# Altium footprint library UWRT_Footprint_Library_2020.PcbLib: 376 footprints (part 19 of 24)
Each footprint in its own frame and in the unit in brackets; x right, y up, seen from the top. Pads: shape width x height; smd on the part's side, far side on the other; paste and mask are expansions set on the pad; w line width, h text height; cw(c..) or ccw(c..) is an arc to the next point about the centre after c.
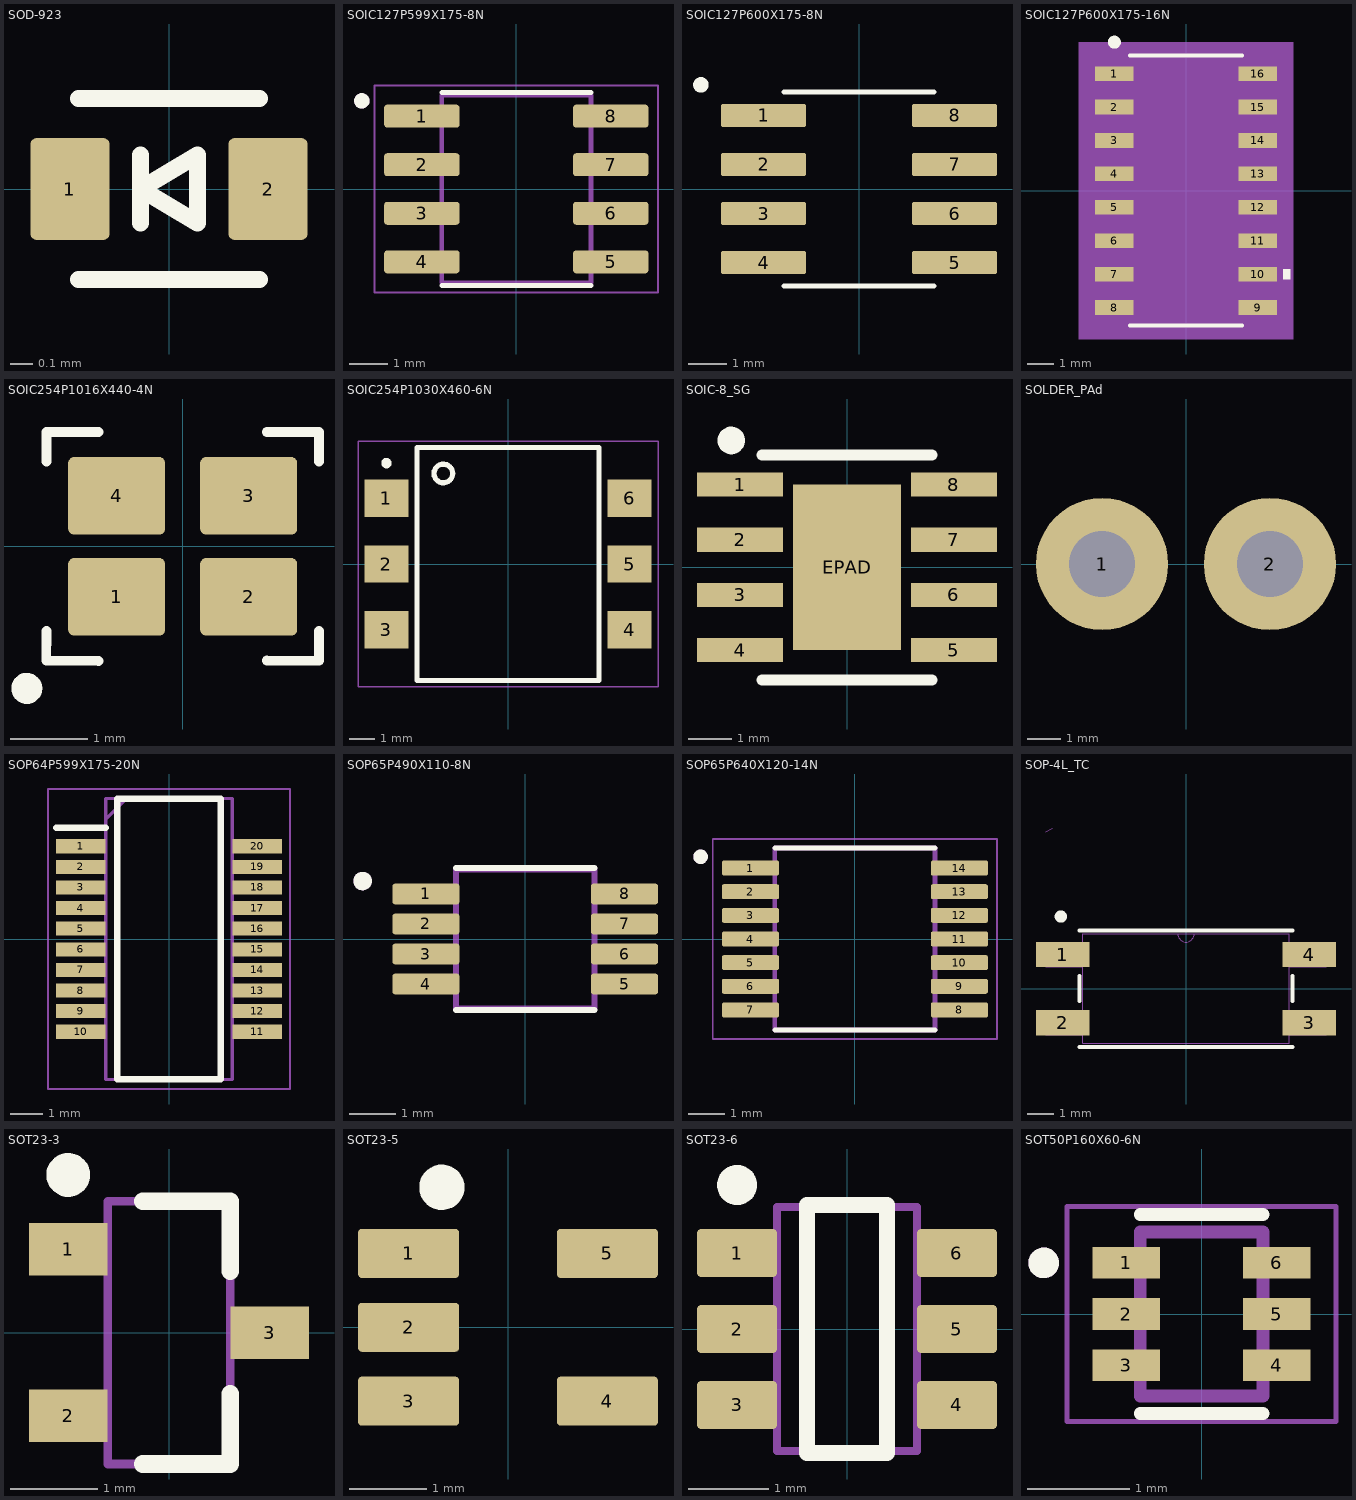
[diagram p18: the footprints below, top view; thin cyan lines are the x and y axes]

## SOD-923 [mm]
pads (2):
  rrect15% 0.35x0.45 smd mask+0.05: 1(-0.437,0) 2(0.437,0)
Top Overlay:
  lines w0.075: -0.4,-0.4 0.4,-0.4 ; -0.4,0.4 0.4,0.4 ; -0.125,-0.15 -0.125,0.15 ; -0.125,0 0.125,0.15 0.125,-0.15 -0.125,0
3D body "SOD-923.step": height 0.43, standoff 0, extent -0.525,-0.325 0.525,0.325

## SOIC127P599X175-8N [mm]
pads (8):
  rrect25% 1.97x0.6 smd: 1(-2.47,1.905) 2(-2.47,0.635) 3(-2.47,-0.635) 4(-2.47,-1.905) 5(2.47,-1.905) 6(2.47,-0.635) 7(2.47,0.635) 8(2.47,1.905)
Top Overlay:
  circle w0.2: c-4.04,2.305 r0.1
  lines w0.127: -1.95,-2.525 1.95,-2.525 ; -1.95,2.525 1.95,2.525
Mechanical 13:
  circle w0.2: c-4.04,2.305 r0.1
  lines w0.127: -1.95,-2.452 1.95,-2.452 1.95,2.452 -1.95,2.452 -1.95,-2.452
Mechanical 15:
  lines w0.05: -3.705,-2.702 3.705,-2.702 3.705,2.702 -3.705,2.702 -3.705,-2.702
3D body "step_temp.STEP": height 1.75, standoff 0, extent -2.997,-2.451 2.997,2.451

## SOIC127P600X175-8N [mm]
pads (8):
  rrect15% 2.2x0.6 smd: 1(-2.475,1.905) 2(-2.475,0.635) 3(-2.475,-0.635) 4(-2.475,-1.905) 5(2.475,-1.905) 6(2.475,-0.635) 7(2.475,0.635) 8(2.475,1.905)
Top Overlay:
  circle w0.2: c-4.1,2.7 r0.1
  lines w0.127: -1.95,-2.51 1.95,-2.51 ; -1.95,2.51 1.95,2.51
3D body "MAX485CSA+T.STEP": height 1.75, standoff 0, extent -3,-2.45 3,2.45

## SOIC127P600X175-16N [mm]
pads (16):
  rect 1.455x0.558 smd paste+0 mask+0: 1(-2.721,4.445) 2(-2.721,3.175) 3(-2.721,1.905) 4(-2.721,0.635) 5(-2.721,-0.635) 6(-2.721,-1.905) 7(-2.721,-3.175) 8(-2.721,-4.445) 9(2.721,-4.445) 10(2.721,-3.175) 11(2.721,-1.905) 12(2.721,-0.635) 13(2.721,0.635) 14(2.721,1.905) 15(2.721,3.175) 16(2.721,4.445)
Top Overlay:
  circle w0.254: c-2.721,5.639 r0.121
  region: 3.703,-2.984 3.957,-2.984 3.957,-3.365 3.703,-3.365
  lines w0.152: -2.121,-5.131 2.121,-5.131 ; -2.121,5.131 2.121,5.131
Mechanical 5:
  region: 4.084,-5.639 -4.084,-5.639 -4.084,5.639 4.084,5.639
Mechanical 13:
  lines w0: -0.305,5.004 ccw(c0,5.004) 0.305,5.004
  lines w0.025: -3.099,-4.699 -1.994,-4.699 -1.994,-4.191 -3.099,-4.191 -3.099,-4.699 ; -3.099,-3.429 -1.994,-3.429 -1.994,-2.921 -3.099,-2.921 -3.099,-3.429 ; -3.099,-2.159 -1.994,-2.159 -1.994,-1.651 -3.099,-1.651 -3.099,-2.159 ; -3.099,-0.889 -1.994,-0.889 -1.994,-0.381 -3.099,-0.381 -3.099,-0.889 ; -3.099,0.381 -1.994,0.381 -1.994,0.889 -3.099,0.889 -3.099,0.381 ; -3.099,1.651 -1.994,1.651 -1.994,2.159 -3.099,2.159 -3.099,1.651 ; -3.099,2.921 -1.994,2.921 -1.994,3.429 -3.099,3.429 -3.099,2.921 ; -3.099,4.191 -1.994,4.191 -1.994,4.699 -3.099,4.699 -3.099,4.191 ; -1.994,-5.004 -1.994,5.004 1.994,5.004 1.994,-5.004 -1.994,-5.004 ; 1.994,-4.699 3.099,-4.699 3.099,-4.191 1.994,-4.191 1.994,-4.699 ; 1.994,-3.429 3.099,-3.429 3.099,-2.921 1.994,-2.921 1.994,-3.429 ; 1.994,-2.159 3.099,-2.159 3.099,-1.651 1.994,-1.651 1.994,-2.159 ; 1.994,-0.889 3.099,-0.889 3.099,-0.381 1.994,-0.381 1.994,-0.889 ; 1.994,0.381 3.099,0.381 3.099,0.889 1.994,0.889 1.994,0.381 ; 1.994,1.651 3.099,1.651 3.099,2.159 1.994,2.159 1.994,1.651 ; 1.994,2.921 3.099,2.921 3.099,3.429 1.994,3.429 1.994,2.921 ; 1.994,4.191 3.099,4.191 3.099,4.699 1.994,4.699 1.994,4.191
  text "*" at -1.93,3.658 h1.27
Mechanical 15:
  region: -2.248,-4.978 -3.703,-4.978 -3.703,4.978 -2.248,4.978 -2.248,5.258 2.248,5.258 2.248,4.978 3.703,4.978 3.703,-4.978 2.248,-4.978 2.248,-5.258 -2.248,-5.258
  lines w0.152: -3.703,-4.978 -2.248,-4.978 -2.248,-5.258 2.248,-5.258 2.248,-4.978 3.703,-4.978 3.703,4.978 2.248,4.978 2.248,5.258 -2.248,5.258 -2.248,4.978 -3.703,4.978 -3.703,-4.978
3D body "D16.step": height 1.76, standoff 0, extent -3.099,-5.004 3.099,5.004

## SOIC254P1016X440-4N [mm]
pads (4):
  rrect15% 1.25x1 smd: 1(-0.85,-0.65) 2(0.85,-0.65) 3(0.85,0.65) 4(-0.85,0.65)
Top Overlay:
  circle w0.2: c-2.007,-1.829 r0.1
  lines w0.127: -1.753,1.091 -1.753,1.472 -1.081,1.47 ; -1.751,-1.091 -1.755,-1.472 -1.083,-1.474 ; 1.083,-1.47 1.755,-1.472 1.755,-1.091 ; 1.083,1.474 1.755,1.472 1.755,1.091
3D body "SMD-4_2P5X2_AVX.step": height 0.56, standoff 0, extent -1.245,-0.851 1.245,0.851

## SOIC254P1030X460-6N [mm]
pads (6):
  rect 1.7x1.45 smd: 1(-4.7,2.54) 2(-4.7,0) 3(-4.7,-2.54) 4(4.7,-2.54) 5(4.7,0) 6(4.7,2.54)
Top Overlay:
  circle w0.2: c-4.7,3.9 r0.1
  circle w0.2: c-2.5,3.5 r0.361
  lines w0.2: -3.525,-4.5 -3.525,4.5 3.525,4.5 3.525,-4.5 -3.525,-4.5
Mechanical 16:
  lines w0.05: -5.8,-4.75 -5.8,4.75 5.8,4.75 5.8,-4.75 -5.8,-4.75
3D body "DIP6-OP7.STEP": height 4.1, standoff -0.27, extent -5.15,-4.3 5.15,4.3

## SOIC-8_SG [mil]
pads (9):
  rect 78x22 smd paste+0 mask+0: 1(-97,75) 2(-97,25) 3(-97,-25) 4(-97,-75) 5(97,-75) 6(97,-25) 7(97,25) 8(97,75)
  rect 98.03x150 smd paste-74.5 mask+0: EPAD(0,0)
Top Overlay:
  circle w15: c-105,115 r5
  lines w10: -77,-102 77,-102 ; -77,102 77,102
Top Paste:
  region: 45.08,71.06 -45.08,71.06 -45.08,28.94 45.08,28.94
  region: 45.08,21.06 -45.08,21.06 -45.08,-21.06 45.08,-21.06
  region: 45.08,-28.94 -45.08,-28.94 -45.08,-71.06 45.08,-71.06
3D body: height 10, standoff 0, extent 0,0 10,10
3D body "SOIC8_SG_4P9X3P9MC.step": height 69.02, standoff 0, extent -122,-96.49 122.01,96.5

## SOLDER_PAd [mm]
pads (2):
  round 4 hole 2: 1(-2.54,0) 2(2.54,0)

## SOP64P599X175-20N [mm]
pads (20):
  rect 1.526x0.435 smd: 1(-2.712,2.858) 2(-2.712,2.222) 3(-2.712,1.588) 4(-2.712,0.952) 5(-2.712,0.318) 6(-2.712,-0.318) 7(-2.712,-0.952) 8(-2.712,-1.588) 9(-2.712,-2.222) 10(-2.712,-2.858) 11(2.712,-2.858) 12(2.712,-2.222) 13(2.712,-1.588) 14(2.712,-0.952) 15(2.712,-0.318) 16(2.712,0.318) 17(2.712,0.952) 18(2.712,1.588) 19(2.712,2.222) 20(2.712,2.858)
Top Overlay:
  lines w0.2: -3.475,3.425 -1.95,3.425 ; -1.6,-4.324 -1.6,4.324 1.6,4.324 1.6,-4.324 -1.6,-4.324
Mechanical 13:
  lines w0.1: -1.95,3.69 -1.314,4.324 ; -1.95,-4.324 -1.95,4.324 1.95,4.324 1.95,-4.324 -1.95,-4.324
Mechanical 15:
  lines w0.05: -3.725,-4.619 -3.725,4.619 3.725,4.619 3.725,-4.619 -3.725,-4.619
3D body "FT231XS-R.stp": height 1.75, standoff 0, extent -2.997,-4.324 2.997,4.324

## SOP65P490X110-8N [mm]
pads (8):
  rrect25% 1.45x0.45 smd: 1(-2.15,0.975) 2(-2.15,0.325) 3(-2.15,-0.325) 4(-2.15,-0.975) 5(2.15,-0.975) 6(2.15,-0.325) 7(2.15,0.325) 8(2.15,0.975)
Top Overlay:
  circle w0.2: c-3.52,1.255 r0.1
  lines w0.127: -1.5,-1.535 1.5,-1.535 ; -1.5,1.535 1.5,1.535
Mechanical 13:
  circle w0.2: c-3.52,1.255 r0.1
  lines w0.127: -1.5,-1.5 1.5,-1.5 1.5,1.5 -1.5,1.5 -1.5,-1.5
3D body "LM74610QDGKRQ1.STEP": height 1.1, standoff 0, extent -2.45,-1.5 2.45,1.5

## SOP65P640X120-14N [mm]
pads (14):
  rrect25% 1.57x0.41 smd: 1(-2.87,1.95) 2(-2.87,1.3) 3(-2.87,0.65) 4(-2.87,0) 5(-2.87,-0.65) 6(-2.87,-1.3) 7(-2.87,-1.95) 8(2.87,-1.95) 9(2.87,-1.3) 10(2.87,-0.65) 11(2.87,0) 12(2.87,0.65) 13(2.87,1.3) 14(2.87,1.95)
Top Overlay:
  circle w0.2: c-4.24,2.26 r0.1
  lines w0.127: -2.2,-2.5 2.2,-2.5 ; -2.2,2.5 2.2,2.5
Mechanical 13:
  circle w0.2: c-4.24,2.26 r0.1
  lines w0.127: -2.2,-2.5 2.2,-2.5 2.2,2.5 -2.2,2.5 -2.2,-2.5
Mechanical 15:
  lines w0.05: -3.905,-2.75 3.905,-2.75 3.905,2.75 -3.905,2.75 -3.905,-2.75
3D body "LSF0204QPWRQ1.STEP": height 1.2, standoff 0, extent -3.2,-2.5 3.2,2.5

## SOP-4L_TC [mil]
pads (4):
  rect 79x37 smd: 1(-181,50) 2(-181,-50) 3(181,-50) 4(181,50)
Top Overlay:
  circle w10: c-184,106 r4
  lines w6: -156.5,-85.5 156.5,-85.5 ; -156.5,-18.4 -156.5,18.4 ; -156.5,85.5 156.5,85.5 ; 156.5,-18.4 156.5,18.4
Mechanical 7:
  lines w1: -206.5,230.5 -196.5,235.5
Mechanical 13:
  lines w0: -12,80.5 ccw(c0,80.5) 12,80.5
  lines w1: -206.5,-67.5 -151.5,-67.5 -151.5,-32.5 -206.5,-32.5 -206.5,-67.5 ; -206.5,32.5 -151.5,32.5 -151.5,67.5 -206.5,67.5 -206.5,32.5 ; -151.5,-80.5 -151.5,80.5 151.5,80.5 151.5,-80.5 -151.5,-80.5 ; 151.5,-67.5 206.5,-67.5 206.5,-32.5 151.5,-32.5 151.5,-67.5 ; 151.5,32.5 206.5,32.5 206.5,67.5 151.5,67.5 151.5,32.5
3D body "SOP-4L_TC.step": height 91.1, standoff 0, extent -206.49,-80.51 206.5,80.52
3D body: height 10, standoff 0, extent 0,0 10,10

## SOT23-3 [mm] "SOT23, 3-Leads, Body 2.90x2.30mm, Pitch 0.95mm, IPC Medium Density"
height 1.1
pads (3):
  rect 0.9x0.6 smd: 1(-1.15,0.95) 2(-1.15,-0.95) 3(1.15,0)
Top Overlay:
  circle w0.25: c-1.15,1.8 r0.125
  lines w0.2: -0.3,-1.5 0.7,-1.5 0.7,-0.7 ; -0.3,1.5 0.7,1.5 0.7,0.7
Mechanical 13:
  lines w0.1: -0.7,-1.5 -0.7,1.5 0.7,1.5 0.7,-1.5 -0.7,-1.5
3D body "SOT95P230X110-3N.step": height 1.1, standoff 0, extent -1.3,-1.5 1.3,1.5

## SOT23-5 [mm]
pads (5):
  rrect15% 1.3x0.63 smd: 1(-1.279,0.95) 2(-1.279,0) 3(-1.279,-0.95) 4(1.279,-0.95) 5(1.279,0.95)
Top Overlay:
  circle w0.3: c-0.85,1.8 r0.141
3D body "SN74AHC1G02DBVT.stp": height 1.2, standoff 0, extent -1.4,-1.45 1.4,1.45

## SOT23-6 [mm] "SOT23, 6-Leads, Body 3.05x1.75mm, Pitch 0.95mm, IPC Medium Density"
height 1.1
pads (6):
  rrect17% 1x0.6 smd: 1(-1.375,0.95) 2(-1.375,0) 3(-1.375,-0.95) 4(1.375,-0.95) 5(1.375,0) 6(1.375,0.95)
Top Overlay:
  circle w0.25: c-1.375,1.8 r0.125
  lines w0.2: -0.5,-1.55 0.5,-1.55 0.5,1.55 -0.5,1.55 -0.5,-1.55
Mechanical 13:
  lines w0.1: -0.875,-1.525 -0.875,1.525 0.875,1.525 0.875,-1.525 -0.875,-1.525
3D body "DDC0006A.stp": height 0.9, standoff -0.02, extent -1.434,-1.485 1.434,1.485

## SOT50P160X60-6N [mm]
pads (6):
  rect 0.66x0.31 smd: 1(-0.735,0.5) 2(-0.735,0) 3(-0.735,-0.5) 4(0.735,-0.5) 5(0.735,0) 6(0.735,0.5)
Top Overlay:
  circle w0.15: c-1.545,0.5 r0.075
  lines w0.127: -0.6,-0.975 0.6,-0.975 ; -0.6,0.975 0.6,0.975
Mechanical 4:
  circle w0.15: c-1.545,0.5 r0.075
  circle w0.15: c-1.545,0.5 r0.075
  lines w0.127: -0.6,-0.8 0.6,-0.8 ; -0.6,-0.8 -0.6,0.8 ; -0.6,-0.8 0.6,-0.8 ; -0.6,-0.8 -0.6,0.8 ; -0.6,0.8 0.6,0.8 ; -0.6,0.8 0.6,0.8 ; 0.6,-0.8 0.6,0.8 ; 0.6,-0.8 0.6,0.8
Mechanical 16:
  lines w0.05: -1.315,-1.05 1.315,-1.05 1.315,1.05 -1.315,1.05 -1.315,-1.05
3D body "DRL0006A.stp": height 0.6, standoff 0, extent -0.8,-0.8 0.8,0.8